# Altium integrated library Mastermind.IntLib: 985 symbols (part 2 of 6)
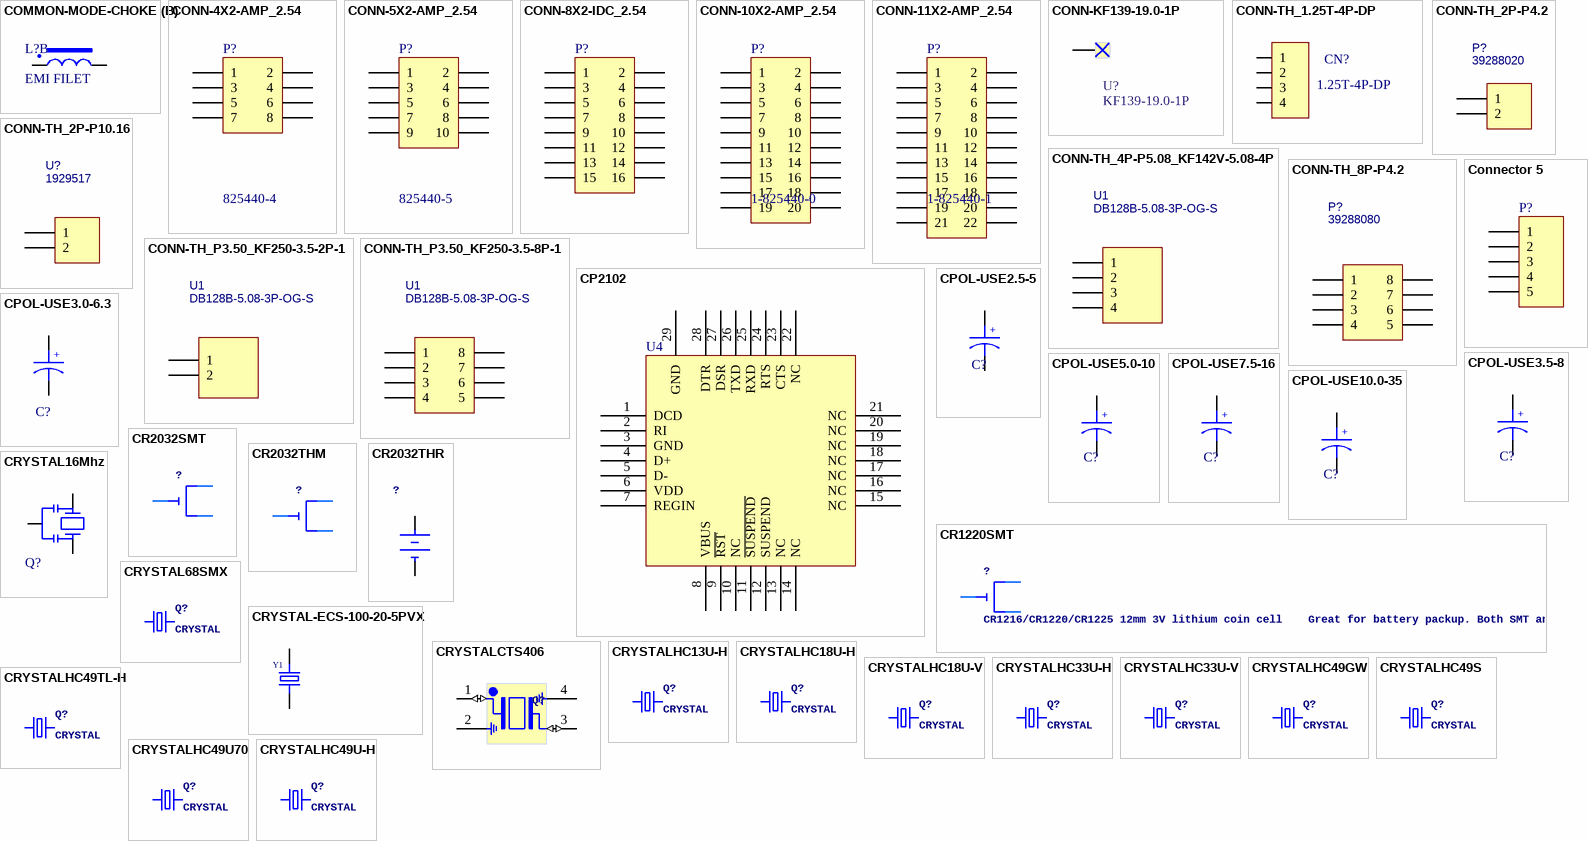
[diagram p41: symbols COMMON-MODE-CHOKE to CRYSTALHC49U-H]

## CONN-8X2-IDC_2.54
designator P?
IDC Connector; LatestRevisionDate: 17-Jul-2002; LatestRevisionNote: Re-released for DXP Platform.; Publisher: Altium Limited
signal-integrity model Connector
footprint 2X08_SHROUDED
pins: 1, 2, 3, 4, 5, 6, 7, 8, 9, 10, 11, 12, 13, 14, 15, 16

## CONN-10X2-AMP_2.54
designator P?, comment 1-825440-0
TE Connectivity AMP Connectors; LatestRevisionDate: 17-Jul-2002; LatestRevisionNote: Re-released for DXP Platform.; Publisher: Altium Limited
signal-integrity model Connector
footprint CONN2X10-AMP
pins: 1, 2, 3, 4, 5, 6, 7, 8, 9, 10, 11, 12, 13, 14, 15, 16, 17, 18, 19, 20

## CONN-11X2-AMP_2.54
designator P?, comment 1-825440-1
TE Connectivity AMP Connectors; LatestRevisionDate: 17-Jul-2002; LatestRevisionNote: Re-released for DXP Platform.; Publisher: Altium Limited
signal-integrity model Connector
footprint CONN2X11-AMP
pins: 1, 2, 3, 4, 5, 6, 7, 8, 9, 10, 11, 12, 13, 14, 15, 16, 17, 18, 19, 20, 21, 22

## CONN-KF139-19.0-1P
designator U?, comment KF139-19.0-1P
Manufacturer: KEFA(科发); Add into BOM: yes; Symbol: KF139-19.0-1P; Device: KF139-19.0-1P; LCSC Part Name: KF139-19.0-1P; Supplier Part: C6392812; Manufacturer Part: KF139-19.0-1P; Supplier Footprint: 插件; JLCPCB Part Class: Extended Part; Datasheet: https://atta.szlcsc.com/upload/public/pdf/source/20230523/9EEA11B50F6D876494A3C4E93D93D143.pdf; Supplier: LCSC; Convert to PCB: yes
footprint CONN-TH_KF139-19.0-1P
pins: 1

## CONN-TH_1.25T-4P-DP
designator CN?, comment 1.25T-4P-DP
CONN-TH_4P-P1.25_1.25T-4P-DP; Manufacturer: 韩国韩荣; Add into BOM: yes; Pins Structure: 1x4P; Pitch: 1.25mm; Number of PINs Per Row: 4; Symbol: 1.25T-4P-DP; Device: 1.25T-4P-DP; LCSC Part Name: 1x4P 间距:1.25mm; Supplier Part: C145936; Manufacturer Part: 1.25T-4P-DP; Supplier Footprint: 插件,P=1.25mm; JLCPCB Part Class: Extended Part; Datasheet: https://atta.szlcsc.com/upload/public/pdf/source/20210511/C145936_7E552BBBEA0510A148F12D708BF3BB1D.pdf; Supplier: LCSC; Convert to PCB: yes; Mounting Style: -; Reference Series: -; Number of Pins: 4P; Number of Rows: 1; Row Spacing: -; Contact Material: Phosphor bronze
footprint CONN-TH_4P-P1.25_1.25T-4P-DP
pins: 1, 2, 3, 4

## CONN-TH_2P-P4.2
designator P?, comment 39288020
MOLEX Pow CONN; Contributor: LCSC; Supplier: LCSC; Supplier Part: C490534; Manufacturer: MOLEX; Manufacturer Part: 39288020; JLCPCB Part Class: Extended Part; spicePre: C; spiceSymbolName: 39288020
footprint CONN-TH_39288020
pins: 1, 2

## CONN-TH_2P-P10.16
designator U?, comment 1929517
60A 600V Green Straight 10.16mm 1 2 Plugin,P=10.16mm Screw terminal ROHS; BOM_Manufacturer: DIBO; BOM_Manufacturer Part: DB128B-5.08-3P-OG-S; Contributor: LCSC; BOM_Supplier: LCSC; BOM_Supplier Part: C500034; BOM_JLCPCB Part Class: Extended Part; spicePre: U; spiceSymbolName: DB128B-5.08-3P-OG-S
footprint CONN-TH_KF139-19.0-2P
pins: 1, 2

## CONN-TH_4P-P5.08_KF142V-5.08-4P
designator U1, comment DB128B-5.08-3P-OG-S
BOM_Manufacturer: DIBO; Contributor: LCSC; BOM_Supplier: LCSC; BOM_Supplier Part: C500034; BOM_Manufacturer Part: DB128B-5.08-3P-OG-S; BOM_JLCPCB Part Class: Extended Part; spicePre: U; spiceSymbolName: DB128B-5.08-3P-OG-S
footprint CONN-TH_4P-P5.08_KF142V-5.08-4P
pins: 1, 2, 3, 4

## CONN-TH_8P-P4.2
designator P?, comment 39288080
Molex POW CONN; Contributor: LCSC; Supplier: LCSC; Supplier Part: C505059; Manufacturer: MOLEX; Manufacturer Part: 39288080; JLCPCB Part Class: Extended Part; spicePre: C; spiceSymbolName: 39288080
footprint CONN-TH_39288080
pins: 1, 2, 3, 4, 5, 6, 7, 8

## CONN-TH_P3.50_KF250-3.5-2P-1
designator U1, comment DB128B-5.08-3P-OG-S
BOM_Manufacturer: DIBO; Contributor: LCSC; BOM_Supplier: LCSC; BOM_Supplier Part: C500034; BOM_Manufacturer Part: DB128B-5.08-3P-OG-S; BOM_JLCPCB Part Class: Extended Part; spicePre: U; spiceSymbolName: DB128B-5.08-3P-OG-S
footprint CONN-TH_P3.50_KF250-3.5-2P-1
pins: 1, 2

## CONN-TH_P3.50_KF250-3.5-8P-1
designator U1, comment DB128B-5.08-3P-OG-S
BOM_Manufacturer: DIBO; Contributor: LCSC; BOM_Supplier: LCSC; BOM_Supplier Part: C500034; BOM_Manufacturer Part: DB128B-5.08-3P-OG-S; BOM_JLCPCB Part Class: Extended Part; spicePre: U; spiceSymbolName: DB128B-5.08-3P-OG-S
footprint CONN-TH_8P-P2.54_KF141V-2.54-8P
pins: 1, 2, 3, 4, 5, 6, 7, 8

## Connector 5
designator P?
XH Header Male Pin 0.100; LatestRevisionDate: 17-Jul-2002; LatestRevisionNote: Re-released for DXP Platform.; Publisher: Altium Limited; JLCPCB#: C146121
signal-integrity model Connector
footprint JST-5-PTH-KIT
footprint JST-5-PTH-ST
footprint JST-5-PTH-KIT - SMD
pins: 1, 2, 3, 4, 5

## CP2102
designator U4
CP2102
footprint QFN28
pins: 1 DCD, 2 RI, 3 GND, 4 D+, 5 D-, 6 VDD, 7 REGIN, 8 VBUS, 9 ~{RST}, 10 NC, 11 ~{SUSPEND}, 12 SUSPEND, 13 NC, 14 NC, 15 NC, 16 NC, 17 NC, 18 NC, 19 NC, 20 NC, 21 NC, 22 NC, 23 CTS, 24 RTS, 25 RXD, 26 TXD, 27 DSR, 28 DTR, 29 GND

## CPOL-USE2.5-5
designator C?, comment 47uF  (value not drawn)
footprint E2,5-5
pins: +, -

## CPOL-USE3.0-6.3
designator C?, comment 47uF  (value not drawn)
footprint E2,5-6.3
pins: +, -

## CPOL-USE3.5-8
designator C?, comment 1000Uf  (value not drawn)
footprint E3,5-8
footprint E3,17-8 -NoOutline
pins: +, -

## CPOL-USE5.0-10
designator C?, comment 10uF  (value not drawn)
footprint E3,5-10
pins: +, -

## CPOL-USE7.5-16
designator C?, comment 10uF  (value not drawn)
footprint E7.5-16
pins: +, -

## CPOL-USE10.0-35
designator C?, comment 10uF  (value not drawn)
footprint E10-35
footprint E10-35-Generic
pins: +, -

## CR1220SMT
designator ?, comment CR1216/CR1220/CR1225 12mm 3V lithium coin cell    Great for battery packup. Both SMT and THM holders.  Note the THM package has the ground pads on both sides of the PCB so that the masks are the same - this reduces the cost
footprint CR1220-SMD
pins: +$1 +, +$2 +1, -

## CR2032SMT
designator ?
footprint CR2032-SMD
pins: +$1 +, +$2 +1, -

## CR2032THM
designator ?
footprint CR2032-THRU
footprint CR2032_HOLDER_SMD
pins: +, +, -

## CR2032THR
designator ?
footprint CR2032_HOLDER_SMD
footprint CR2032-THRUHOLE
pins: +, -

## CRYSTAL16Mhz
designator Q?, comment 16MHz  (value not drawn)
Crystal Osscilator; OC_FARNELL: unknown; OC_NEWARK: unknown
footprint CSTCE16M 3215
pins: 1, 2, 3

## CRYSTAL68SMX
designator Q?, comment CRYSTAL
OC_FARNELL: 6344860; OC_NEWARK: unknown
footprint 86SMX
pins: 1, 4 2

## CRYSTAL-ECS-100-20-5PVX
designator Y1, comment crystal  (value not drawn)
10MHz Â±30ppm Crystal 20pF 60 Ohms HC-49/US; MP: ECS-100-20-5PVX; MF: ECS Inc.; Availability: Warning; SnapEDA_Link: https://www.snapeda.com/parts/ECS-100-20-5PVX/ECS%20Inc./view-part/2721546/?ref=snap; Value: *; Price: None; Package: HC49/US ECS International; Check_prices: https://www.snapeda.com/parts/ECS-100-20-5PVX/ECS%20Inc./view-part/2721546/?ref=eda
footprint HC-49US_L11.5-W4.5-P4.88
footprint OSC-SMD_2P-L5.0-W3.2
footprint XTAL1
pins: 1, 2

## CRYSTALCTS406
designator Q?, comment CRYSTAL  (value not drawn)
CRYSTALCTS406; OC_FARNELL: unknown; OC_NEWARK: unknown; Parameter 1: *
footprint 3225
footprint CRYSTAL-SMD_4P-L3.2-W2.5-BL-2
footprint OSC-SMD_4P-L2.0-W1.6-BL
footprint CRYSTAL-SMD_4P-L2.5-W2.0-BL-A
pins: 1 IN (io), 2 GND, 3 OUT (io), 4 GND

## CRYSTALHC13U-H
designator Q?, comment CRYSTAL
OC_FARNELL: unknown; OC_NEWARK: unknown
footprint HC13U-H
pins: 1, 2

## CRYSTALHC18U-H
designator Q?, comment CRYSTAL
OC_FARNELL: unknown; OC_NEWARK: unknown
footprint HC18U-H
pins: 1, 2

## CRYSTALHC18U-V
designator Q?, comment CRYSTAL
OC_FARNELL: unknown; OC_NEWARK: unknown
footprint HC18U-V
pins: 1, 2

## CRYSTALHC33U-H
designator Q?, comment CRYSTAL
OC_FARNELL: unknown; OC_NEWARK: unknown
footprint HC33U-H
pins: 1, 2

## CRYSTALHC33U-V
designator Q?, comment CRYSTAL
OC_FARNELL: unknown; OC_NEWARK: unknown
footprint HC33U-V
pins: 1, 2

## CRYSTALHC49GW
designator Q?, comment CRYSTAL
OC_FARNELL: unknown; OC_NEWARK: unknown
footprint HC49GW
pins: 1, 2

## CRYSTALHC49S
designator Q?, comment CRYSTAL
OC_FARNELL: 1667008; OC_NEWARK: unknown
footprint HC49/S
pins: 1, 2

## CRYSTALHC49TL-H
designator Q?, comment CRYSTAL
OC_FARNELL: unknown; OC_NEWARK: unknown
footprint HC49TL-H
pins: 1, 2

## CRYSTALHC49U70
designator Q?, comment CRYSTAL
OC_FARNELL: unknown; OC_NEWARK: unknown
footprint HC49U70
pins: 1, 2

## CRYSTALHC49U-H
designator Q?, comment CRYSTAL
OC_FARNELL: 1666973; OC_NEWARK: unknown
footprint HC49U-H
pins: 1, 2

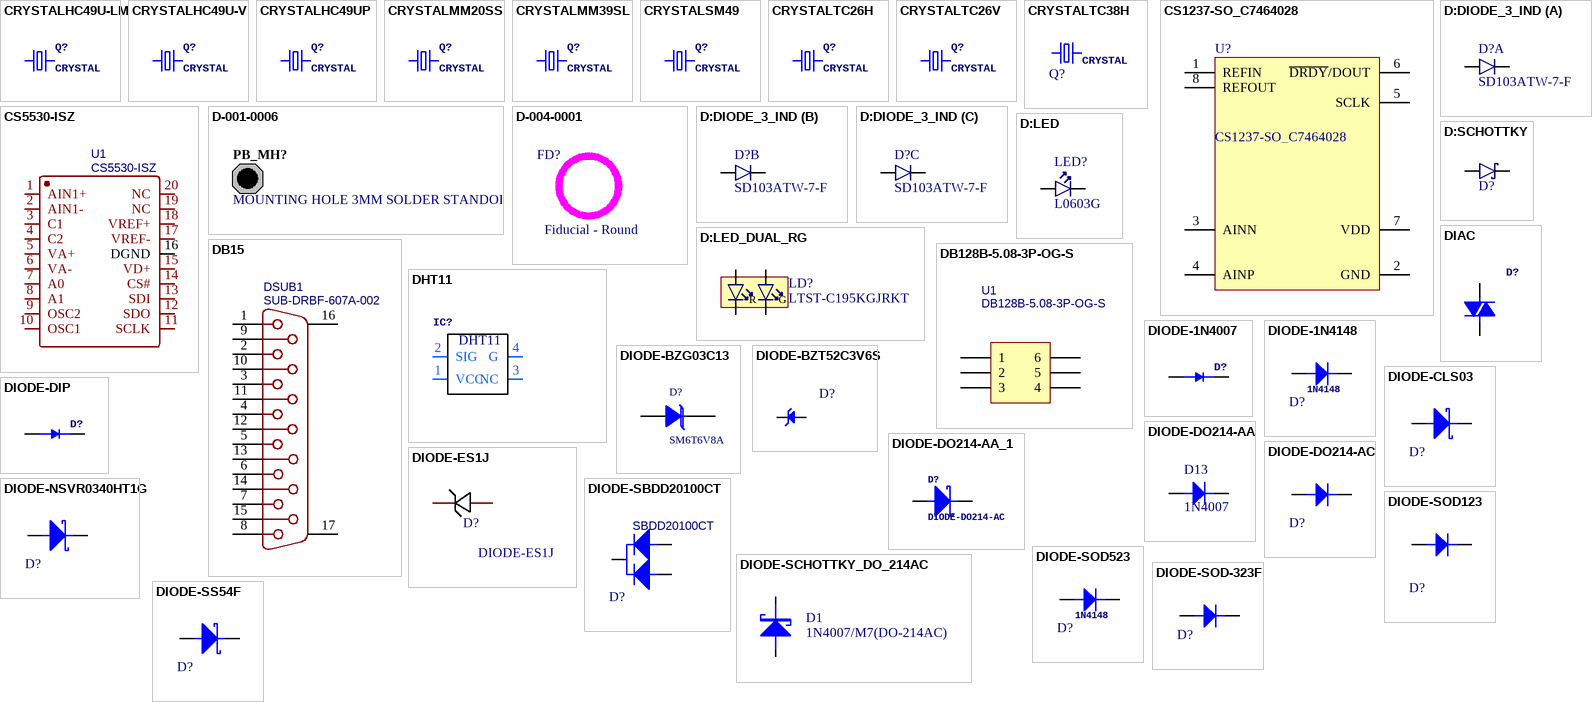
[diagram p9: symbols CRYSTALHC49U-LM to DIODE-SS54F]

## CRYSTALHC49U-LM
designator Q?, comment CRYSTAL
OC_FARNELL: 1666956; OC_NEWARK: unknown
footprint HC49U-LM
pins: 1, 2

## CRYSTALHC49U-V
designator Q?, comment CRYSTAL
OC_FARNELL: 1666969; OC_NEWARK: unknown
footprint HC49U-V
pins: 1, 2

## CRYSTALHC49UP
designator Q?, comment CRYSTAL
OC_FARNELL: unknown; OC_NEWARK: unknown
footprint HC49UP
pins: 1, 2

## CRYSTALMM20SS
designator Q?, comment CRYSTAL
OC_FARNELL: unknown; OC_NEWARK: unknown
footprint MM20SS
pins: 1, 4 2

## CRYSTALMM39SL
designator Q?, comment CRYSTAL
OC_FARNELL: unknown; OC_NEWARK: unknown
footprint MM39SL
pins: 1, 4 2

## CRYSTALSM49
designator Q?, comment CRYSTAL
OC_FARNELL: unknown; OC_NEWARK: unknown
footprint SM49
pins: 1, 2

## CRYSTALTC26H
designator Q?, comment CRYSTAL
OC_FARNELL: unknown; OC_NEWARK: unknown
footprint TC26H
pins: 1, 2

## CRYSTALTC26V
designator Q?, comment CRYSTAL
OC_FARNELL: unknown; OC_NEWARK: unknown
footprint TC26V
pins: 1, 2

## CRYSTALTC38H
designator Q?, comment CRYSTAL
OC_FARNELL: unknown; OC_NEWARK: unknown
footprint TC38H
footprint TC38H - SMD
pins: 1, 2

## CS1237-SO_C7464028
designator U?
CS1237 24-Bit High Precision ADC with Delta-Sigma Modulator; Manufacturer: CHIPSEA(芯海科技); Contributor: lcsc; Supplier: LCSC; Supplier Part: C7464028; Manufacturer Part: CS1237-SO; JLCPCB Part Class: Extended Part; spicePre: U; spiceSymbolName: CS1237-SO_C7464028
footprint SOIC-8E (SOIC, 8-Leads, Body 4.90x3.90mm, Pitch 1.27mm, IPC Medium Density)
pins: 1 REFIN, 2 GND, 3 AINN, 4 AINP, 5 SCLK, 6 ~{DRDY}/DOUT, 7 VDD, 8 REFOUT

## CS5530-ISZ
designator U1
BOM_Manufacturer: Cirrus Logic(凌云); spicePre: X; BOM_Manufacturer Part: CS5530-ISZ; BOM_Supplier: LCSC; BOM_Supplier Part: C9929; BOM_JLCPCB Part Class: Extended Part; spiceSymbolName: CS5530-ISZ
footprint SSOP-20_L7.2-W5.3-P0.65-LS7.8-BL
pins: 1 AIN1+, 2 AIN1-, 3 C1, 4 C2, 5 VA+, 6 VA-, 7 A0, 8 A1, 9 OSC2, 10 OSC1, 11 SCLK, 12 SDO, 13 SDI, 14 CS#, 15 VD+, 16 DGND, 17 VREF-, 18 VREF+, 19 NC, 20 NC

## D-001-0006
designator PB_MH?, comment MOUNTING HOLE 3MM SOLDER STANDOFF  (no BOM)
Mounting Hole for Solder Standoff, M3 Screw, Plated, Round Pad; Category: Mounting-Hole; Status: Production
footprint STANDOFF_SOLDER_3MM
pins: 1 hidden

## D-004-0001
designator FD?, comment Fiducial - Round
Fiducial - Round 1.5mm Top-Bottom; Status: Unreleased; Category: Fiducial
footprint FIDUCIAL ROUND

## D:DIODE_3_IND
designator D?, comment SD103ATW-7-F
Surface Mount Schottky Barrier Diode Array; Manufacturer: Diodes Incorporated; 2nd source part number: 177-3507; Artikkelnr Noca: 10029109; Artikkelnr Simpro: N.A.; Part Number: SD103ATW-7-F; Manufacturer Part Number: SD103ATW-7-F; Datasheet: http://www.diodes.com/datasheets/ds30374.pdf; LatestRevisionDate: 2012-06-15; Publisher: Nordic Semiconductor; Published: 2012-06-15; Value: SD103ATW-7-F; Note: *; Supplier: Digi-Key; Supplier part number: SD103ATW-FDITR-ND; 2nd source Supplier: Farnell; Footprint Doc: SOT-363
footprint SOT-363
part A pins: 1 C1, 6 A1
part B pins: 2 C2, 5 A2
part C pins: 3 C3, 4 A3

## D:LED
designator LED?, comment L0603G
LED SMARTLED GREEN 570NM 0603; Part Number: LG L29K Smartled Green; Manufacturer: Multicomp; Manufacturer Part Number: LG L29K-G2J1-24-Z; Note: 2,24..5.6 mcd, Vfmin=1.7V; Artikkelnr Noca: N.A.; Datasheet: http://www.osram-os.com/Graphics/XPic2/00077107_0.pdf; Footprint Doc: 0603; LatestRevisionDate: 2014-10-28; Pin Count: 2; Publisher: Nordic Semiconductor; Published: 2014-10-28; Value: L0603G; Supplier: Digi-Key; Supplier part number: 475-2709-1-ND; 2nd source Supplier: *; 2nd source part number: *; Artikkelnr Simpro: N.A.
footprint LED_0603_G
pins: 1 C, 2 A

## D:LED_DUAL_RG
designator LD?, comment LTST-C195KGJRKT
Ultra bright AlInGaP Bi-Color LED; Manufacturer: Lite-On Inc; 2nd source part number: 859-LTST-C195KGJRKT; Artikkelnr Noca: 13019145; Artikkelnr Simpro: N.A.; Part Number: LTST-C195KGJRKT; Manufacturer Part Number: LTST-C195KGJRKT; Datasheet: http://media.digikey.com/pdf/Data%20Sheets/Lite-On%20PDFs/LTST-C195KGJRKT.pdf; LatestRevisionDate: 2013-02-11; Pin Count: 4; Publisher: Nordic Semiconductor; Published: 2012-07-05; Value: LTST-C195KGJRKT; Note: *; Supplier: Digi-Key; Supplier part number: 160-1452-1-ND; 2nd source Supplier: Mouser; Footprint Doc: LED_DUAL_0606
footprint LED_DUAL_0606
pins: 1 A2, 2 A1, 3 C2, 4 C1
text: R; G

## D:SCHOTTKY
designator D?, comment 1PS79SB30.115  (value not drawn)
Diode Schottky Vf=0.38, Vr=40V, If=200mA, Ir=500nA; Manufacturer: NXP; Artikkelnr Noca: N.A.; Part Number: 1PS79SB30.115; Manufacturer Part Number: 1PS79SB30.115; Datasheet: http://www.nxp.com/documents/data_sheet/1PS79SB30.pdf; Footprint Doc: SOD-523; LatestRevisionDate: 2014-09-24; Pin Count: 2; Publisher: Nordic Semiconductor; Published: 2014-09-24; Value: 1PS79SB30.115; Note: *; Supplier: Digi-Key; Supplier part number: 568-5973-1-ND; 2nd source Supplier: *; 2nd source part number: *; Artikkelnr Simpro: N.A.
footprint SOD-523
pins: A, K C

## DB15
designator DSUB1, comment SUB-DRBF-607A-002
BOM_Manufacturer: Nextron(正凌); Contributor: LCSC; BOM_Supplier: LCSC; BOM_Supplier Part: C2846090; BOM_Manufacturer Part: SUB-DRBF-607A-002; BOM_JLCPCB Part Class: Extended Part; spicePre: D; spiceSymbolName: SUB-DRBF-607A-002
footprint DSUB-TH_FDB1502-F0DB300K6KA-Female
footprint DSUB-TH_FDB1502-F0DB300K6KA-Male
pins: 1, 2, 3, 4, 5, 6, 7, 8, 9, 10, 11, 12, 13, 14, 15, 16 MH2, 17 MH1

## DB128B-5.08-3P-OG-S
designator U1
BOM_Manufacturer: DIBO; Contributor: LCSC; BOM_Supplier: LCSC; BOM_Supplier Part: C500034; BOM_Manufacturer Part: DB128B-5.08-3P-OG-S; BOM_JLCPCB Part Class: Extended Part; spicePre: U; spiceSymbolName: DB128B-5.08-3P-OG-S
footprint CONN-TH_DB128B-5.08-3P-XX-S
footprint CONN-TH_KF250T-5.0-2X3P
pins: 1, 2, 3, 4, 5, 6

## DHT11
designator IC?, comment TIMERChanged DIP package to have round (not oval) pin pads    http://www.ladyada.net/library/pcb/eaglelibrary.html
footprint DHT11
pins: 1 VCC (power), 2 SIG, 3 NC (power), 4 G

## DIAC
designator D?, comment Diac  (value not drawn)
footprint TO220DS
pins: T1 A1, T2 A2

## DIODE-1N4007
designator D?
DIODE   General purpose 1N400x type rectifier    (With bigger pads)   http://www.ladyada.net/library/pcb/eaglelibrary.html
footprint DO41-10
pins: A, C

## DIODE-1N4148
designator D?, comment 1N4148
footprint DO-1N4148
footprint DO100-AA
footprint DO-1N4148 - 10mm
pins: A, K

## DIODE-BZG03C13
designator D?, comment SM6T6V8A
Zener TVS, 6.2V, 5W; Manufacturer: Microsemi; Revision: 31-Oct-2003
footprint DO214
pins: 1 A, 2 K

## DIODE-BZT52C3V6S
designator D?, comment BZT52C3V6S/W4  (value not drawn)
Independent Type 200mW 3.6V~3.8V 3.4V SOD-323 Zener Diodes ROHS; Manufacturer: YFW(佑风微); Symbol: BZT52C3V6S_C5270767; Add into BOM: yes; Reverse Leakage Current (Ir): 5uA@1V; Zener Impedance (Zzt): 90Ω; Device: BZT52C3V6S_C5270767; LCSC Part Name: BZT52C3V6S; Manufacturer Part: BZT52C3V6S; Supplier Footprint: SOD-323; JLCPCB Part Class: Extended Part; Datasheet: https://atta.szlcsc.com/upload/public/pdf/source/20221116/07630275E16F5BD1867C326257346985.pdf; Supplier: LCSC; Convert to PCB: yes; Diode Configuration: Independent Type; Zener Voltage (Nom): 3.4V; Zener Voltage (Range): 3.6V~3.8V; Power Dissipation: 200mW; Supplier Part: C5270767
footprint SOD-323
pins: A (power), K C (power)

## DIODE-CLS03
designator D?, comment CLS03  (value not drawn)
Diode; Designator: *
footprint SMC_L5.9-W4.1-LS8.7-RD
pins: 1 C, 2 A

## DIODE-DIP
designator D?
DIODE   General purpose 1N400x type rectifier    (With bigger pads)   http://www.ladyada.net/library/pcb/eaglelibrary.html
footprint DO41-10
pins: A, C

## DIODE-DO214-AA
designator D13, comment 1N4007
SMD Diode DO214-AC
footprint DO214-AA
pins: A, C

## DIODE-DO214-AA_1
designator D?, comment DIODE-DO214-AC
Diode   SMADIODE - SMA Surface Mount Package  20V 1A Schottky Diode Digikey: 641-1014-6-ND    DO-1N4148 - Through Hole Small Current Diode SOD-123 20V 1 A (.5mV Vf) Schottky Diode - Digikey: MBRX120TPMSCT-ND    SOD-323 10V 570mA (.38mV Vf, 3ns) Schottky Diode - Digikey: ZLLS410CT-ND    SOD-523 30V 30mA Schottky Diode (RB751S-40TE61) - Digikey: RB751S-40TE61CT-ND    SOT23-R/W - SOT23 Package (R = Solder Paste/Reflow Ovens, W = Hand-Soldering)  BAT54Film 40V 300mA - Digikey: 497-7162-1-ND
footprint DO214-AA
pins: A, C

## DIODE-DO214-AC
designator D?  (value not drawn)
Designator: *
footprint DO214-AC
pins: A, C

## DIODE-ES1J
designator D?
Manufacturer: MDD(辰达半导体); Manufacturer Part: ES1J; Symbol: ES1JG_C412438; Device: ES1J_C412438; Add into BOM: yes; Forward Voltage (Vf@If): 1.7V@1A; Reverse Leakage Current: 5uA@600V; LCSC Part Name: 电压:600V 电流:1A; Supplier Part: C412438; Supplier Footprint: SMA; JLCPCB Part Class: Extended Part; Datasheet: https://atta.szlcsc.com/upload/public/pdf/source/20230314/8FCBE4D1988E86B6B35ACD92F03E7C76.pdf; Supplier: LCSC; Convert to PCB: yes; Operating Temperature: -55℃~+150℃@(Tj)
footprint SMA_L4.4-W2.8-LS5.4-RD
pins: 1 C, 2 A

## DIODE-NSVR0340HT1G
designator D?, comment NSVR0340HT1G  (value not drawn)
Schottky Diode / NSVR0340HT1G; Designator: *
footprint SOD-323
pins: A, K C

## DIODE-SBDD20100CT
designator D?, comment SBDD20100CT
Schottky Barrier Diodes; Manufacturer: CJ(江苏长电/长晶); Contributor: LCSC; Supplier: LCSC; Supplier Part: C513356; Manufacturer Part: SBDD20100CT; JLCPCB Part Class: Extended Part; spicePre: U; spiceSymbolName: SBDD20100CT
footprint TO252
pins: 1 A, 2 A, 3 K

## DIODE-SCHOTTKY_DO_214AC
designator D1, comment 1N4007/M7(DO-214AC)
Surface mount schottky diode DO-214AC(SMA) Package
footprint SMT_DIODE_DO_214AC (DO-214AC(SMA) Package)
pins: 1 A, 2 K

## DIODE-SOD123
designator D?
Schottky Diode
footprint SOD-123
footprint SOD-123HE1_L3.0-W2.0-LS3.7-RD
pins: 1 C, 2 A

## DIODE-SOD523
designator D?, comment 1N4148
footprint SOD-523
pins: A, K C

## DIODE-SOD-323F
designator D?, comment Diode   SMADIODE - SMA Surface Mount Package  20V 1A Schottky Diode Digikey: 641-1014-6-ND    DO-1N4148 - Through Hole Small Current Diode SOD-123 20V 1 A (.5mV Vf) Schottky Diode - Digikey: MBRX120TPMSCT-ND    SOD-323 10V 570mA (.38mV Vf, 3ns) Schottky Diode - Digikey: ZLLS410CT-ND    SOD-523 30V 30mA Schottky Diode (RB751S-40TE61) - Digikey: RB751S-40TE61CT-ND    SOT23-R/W - SOT23 Package (R = Solder Paste/Reflow Ovens, W = Hand-Soldering)  BAT54Film 40V 300mA - Digikey: 497-7162-1-ND  (value not drawn)
Parameter 1: *
footprint SOD-323
pins: A, K C

## DIODE-SS54F
designator D?, comment DIODE-DO214-AC  (value not drawn)
Schottky Diode; Designator: *
footprint DO214-AC
pins: A, C

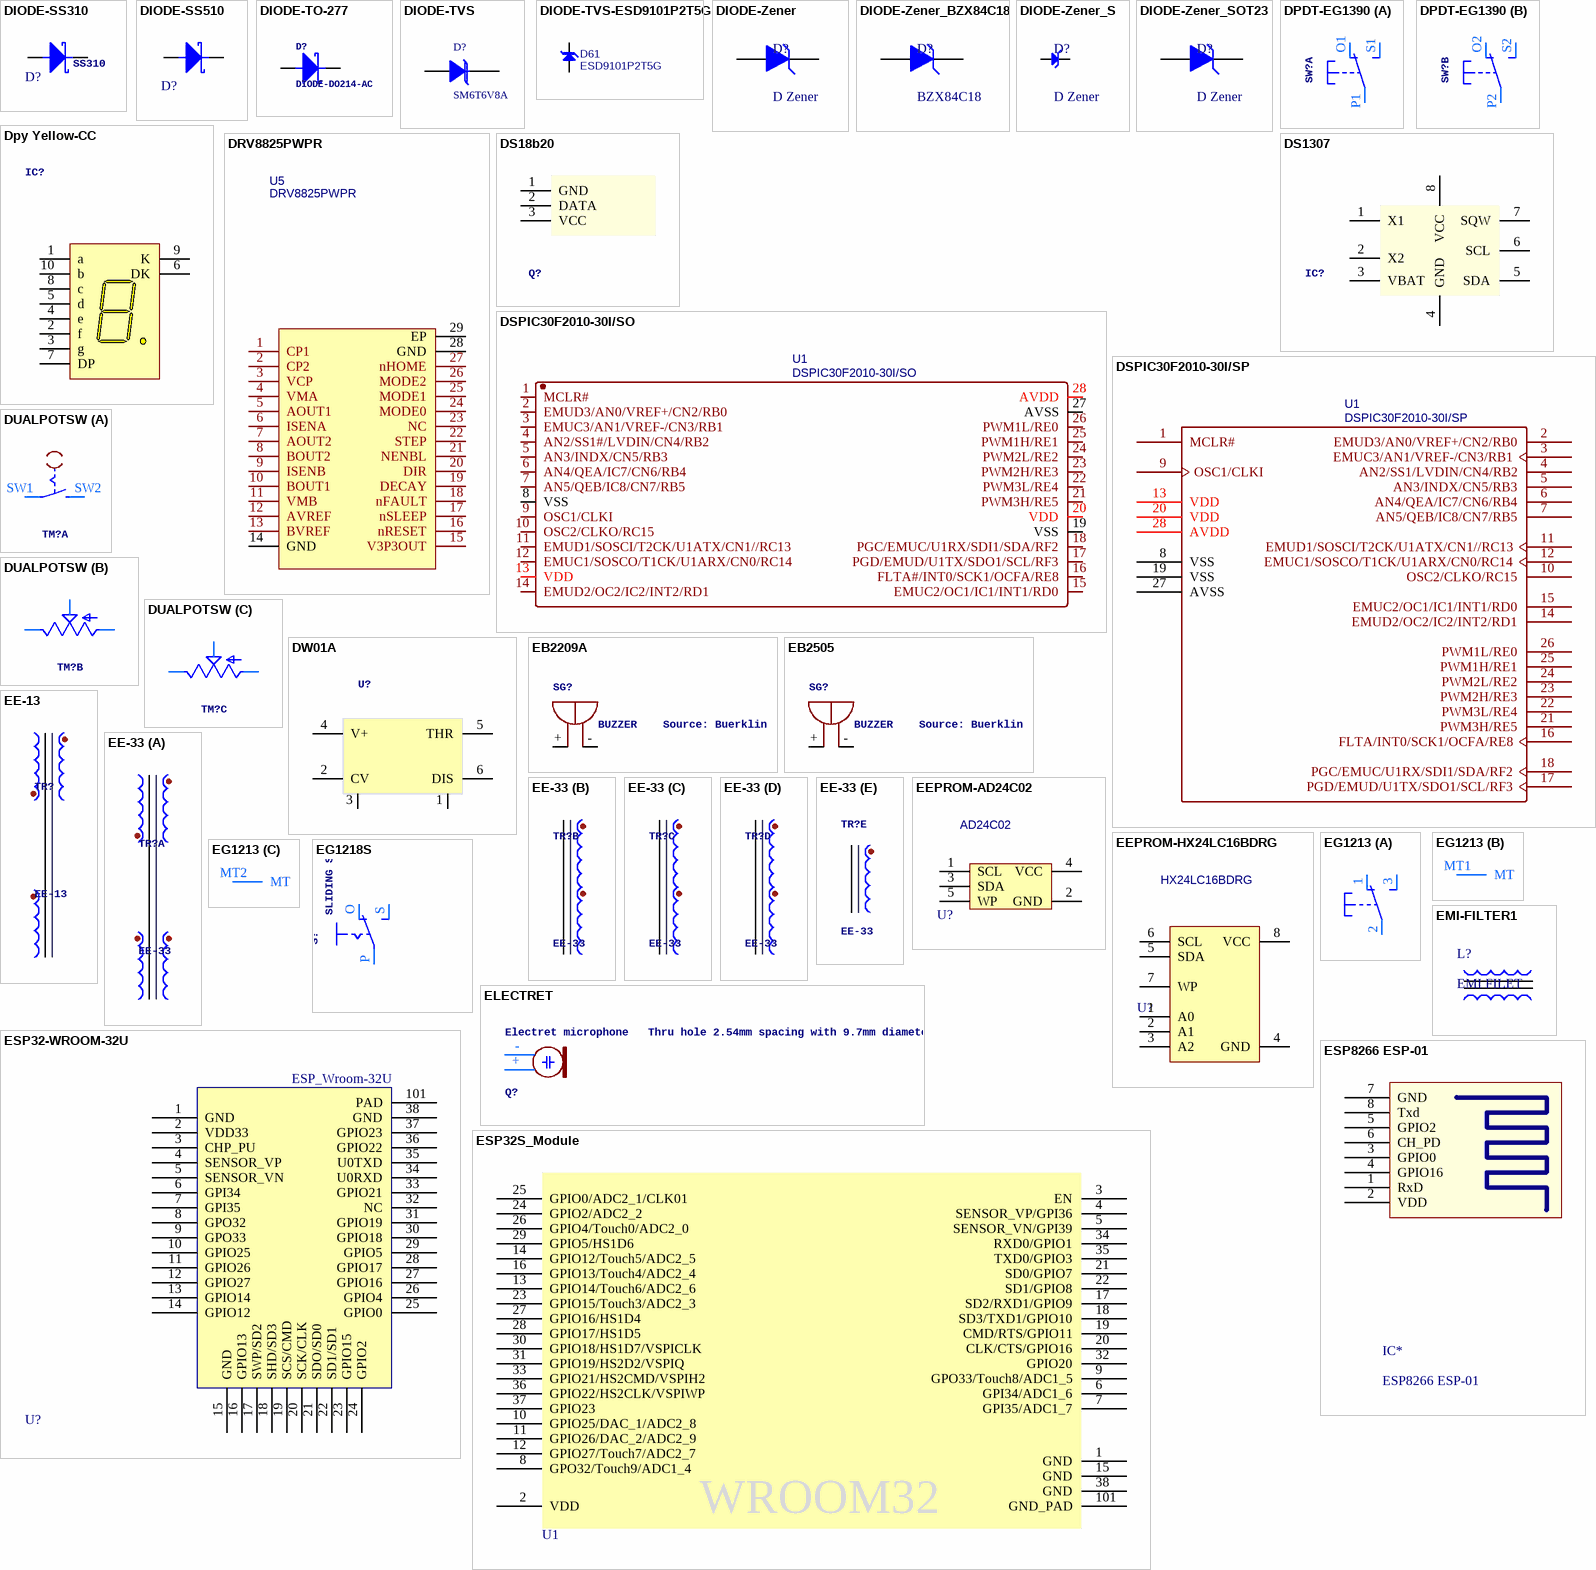
[diagram p10: symbols DIODE-SS310 to ESP8266 ESP-01]

## DIODE-SS310
designator D?, comment SS310
Schottky Diode
footprint DO214A
pins: 1 A, 2 C

## DIODE-SS510
designator D?, comment SS510  (value not drawn)
Schottky Diode; Designator: *
footprint SMC_L7.1-W6.2-LS8.1-RD
pins: 1 C, 2 A

## DIODE-TO-277
designator D?, comment DIODE-DO214-AC
Schottky Diode
footprint TO-277
pins: A, C

## DIODE-TVS
designator D?, comment SM6T6V8A
Tvs Diode, 6.2V, 5W; Manufacturer: Microsemi; Revision: 31-Oct-2003
footprint DO214
pins: 1 A, 2 K

## DIODE-TVS-ESD9101P2T5G
designator D61, comment ESD9101P2T5G
ESD Protection Diode; Manufacturer Name: OnSemi; Manufacturer Part No.: ESD9101P2T5G
footprint SOD-923 (SOD-923, 2-Leads, Body 0.60x1.00mm, IPC Medium Density)
pins: 1 C (power), 2 A (power)

## DIODE-Zener
designator D?, comment D Zener
Zener Diode; Published: 8-Jun-2000; LatestRevisionDate: 17-Jul-2002; LatestRevisionNote: Re-released for DXP Platform.; PackageReference: DIODE-0.7; Publisher: Altium Limited; PackageDescription: Diode, Thru-Hole; 2 Leads; 0.7 in Pin Spacing
simulation model ZENER (Diode)
signal-integrity model D Zener
footprint SOD-323
footprint DO100-AA
footprint DO-1N4148
footprint DO-1N4148 - 10mm
footprint SOD-123HE1_L3.0-W2.0-LS3.7-RD - KA
pins: A, K

## DIODE-Zener_BZX84C18
designator D?, comment BZX84C18
Zener Diode 18V; Published: 8-Jun-2000; LatestRevisionDate: 17-Jul-2002; LatestRevisionNote: Re-released for DXP Platform.; PackageReference: DIODE-0.7; Publisher: Altium Limited; PackageDescription: Diode, Thru-Hole; 2 Leads; 0.7 in Pin Spacing
footprint SOT23; pin to pad 1>1+2
pins: 1 A, 3 K

## DIODE-Zener_S
designator D?, comment D Zener
Zener Diode, Vz=15V, 300mW; Published: 8-Jun-2000; LatestRevisionDate: 17-Jul-2002; LatestRevisionNote: Re-released for DXP Platform.; PackageReference: DIODE-0.7; Publisher: Altium Limited; PackageDescription: Diode, Thru-Hole; 2 Leads; 0.7 in Pin Spacing
simulation model ZENER (Diode)
signal-integrity model D Zener
footprint SOD-323
pins: A (power), K C (power)

## DIODE-Zener_SOT23
designator D?, comment D Zener
Zener Diode; Published: 8-Jun-2000; LatestRevisionDate: 17-Jul-2002; LatestRevisionNote: Re-released for DXP Platform.; PackageReference: DIODE-0.7; Publisher: Altium Limited; PackageDescription: Diode, Thru-Hole; 2 Leads; 0.7 in Pin Spacing
footprint SOT23
pins: 1 A, 3 K

## DPDT-EG1390
designator SW?
footprint EG1390
part A pins: O1 O, P1 P, S1 S
part B pins: O2 O, P2 P, S2 S

## Dpy Yellow-CC
designator IC?, comment TIMERChanged DIP package to have round (not oval) pin pads    http://www.ladyada.net/library/pcb/eaglelibrary.html  (value not drawn)
footprint 7-Segment
pins: 1 a "Anode", 2 f "Anode", 3 g "Anode", 4 e "Anode", 5 d "Anode", 6 DK "Cathode", 7 DP "Anode", 8 c "Anode", 9 K "Cathode", 10 b "Anode"

## DRV8825PWPR
designator U5
BOM_Manufacturer: TI(德州仪器); BOM_Supplier: LCSC; BOM_Manufacturer Part: DRV8825PWPR; BOM_Supplier Part: C81582; BOM_JLCPCB Part Class: Extended Part; spicePre: U; spiceSymbolName: DRV8825PWPR
footprint HTSSOP-28_L9.7-W4.4-P0.65-LS6.4-BL-EP
pins: 1 CP1, 2 CP2, 3 VCP, 4 VMA, 5 AOUT1, 6 ISENA, 7 AOUT2, 8 BOUT2, 9 ISENB, 10 BOUT1, 11 VMB, 12 AVREF, 13 BVREF, 14 GND, 15 V3P3OUT, 16 nRESET, 17 nSLEEP, 18 nFAULT, 19 DECAY, 20 DIR, 21 NENBL, 22 STEP, 23 NC, 24 MODE0, 25 MODE1, 26 MODE2, 27 nHOME, 28 GND, 29 EP

## DS18b20
designator Q?
Dellas temperature sensor
footprint TO92-INLINE
pins: 1 GND, 2 DATA, 3 VCC

## DS1307
designator IC?, comment DS1307   Real time clock (RTC) with battery backup ability. Talk to it via i2c  (value not drawn)
footprint DIL08
footprint SOP8
pins: 1 X1, 2 X2, 3 VBAT, 4 GND, 5 SDA, 6 SCL, 7 SQW (power), 8 VCC (power)

## DSPIC30F2010-30I/SO
designator U1
Manufacturer: MICROCHIP(美国微芯); Supplier: LCSC; Manufacturer Part: DSPIC30F2010-30I/SO; Supplier Part: C9797; JLCPCB Part Class: Extended Part; spicePre: U; spiceSymbolName: DSPIC30F2010-30I/SO
footprint SOIC-28_L18.0-W7.5-P1.27-LS10.3-BL
pins: 1 MCLR#, 2 EMUD3/AN0/VREF+/CN2/RB0, 3 EMUC3/AN1/VREF-/CN3/RB1, 4 AN2/SS1#/LVDIN/CN4/RB2, 5 AN3/INDX/CN5/RB3, 6 AN4/QEA/IC7/CN6/RB4, 7 AN5/QEB/IC8/CN7/RB5, 8 VSS, 9 OSC1/CLKI, 10 OSC2/CLKO/RC15, 11 EMUD1/SOSCI/T2CK/U1ATX/CN1//RC13, 12 EMUC1/SOSCO/T1CK/U1ARX/CN0/RC14, 13 VDD, 14 EMUD2/OC2/IC2/INT2/RD1, 15 EMUC2/OC1/IC1/INT1/RD0, 16 FLTA#/INT0/SCK1/OCFA/RE8, 17 PGD/EMUD/U1TX/SDO1/SCL/RF3, 18 PGC/EMUC/U1RX/SDI1/SDA/RF2, 19 VSS, 20 VDD, 21 PWM3H/RE5, 22 PWM3L/RE4, 23 PWM2H/RE3, 24 PWM2L/RE2, 25 PWM1H/RE1, 26 PWM1L/RE0, 27 AVSS, 28 AVDD

## DSPIC30F2010-30I/SP
designator U1
Manufacturer: MICROCHIP(美国微芯); Supplier: LCSC; Manufacturer Part: DSPIC30F2010-30I/SP; Supplier Part: C134088; JLCPCB Part Class: Extended Part; spicePre: U; spiceSymbolName: DSPIC30F2010-30I/SP
footprint DIP-28_L34.6-W7.3-P2.54-LS10.2-BL
pins: 1 MCLR#, 2 EMUD3/AN0/VREF+/CN2/RB0, 3 EMUC3/AN1/VREF-/CN3/RB1, 4 AN2/SS1/LVDIN/CN4/RB2, 5 AN3/INDX/CN5/RB3, 6 AN4/QEA/IC7/CN6/RB4, 7 AN5/QEB/IC8/CN7/RB5, 8 VSS, 9 OSC1/CLKI, 10 OSC2/CLKO/RC15, 11 EMUD1/SOSCI/T2CK/U1ATX/CN1//RC13, 12 EMUC1/SOSCO/T1CK/U1ARX/CN0/RC14, 13 VDD, 14 EMUD2/OC2/IC2/INT2/RD1, 15 EMUC2/OC1/IC1/INT1/RD0, 16 FLTA/INT0/SCK1/OCFA/RE8, 17 PGD/EMUD/U1TX/SDO1/SCL/RF3, 18 PGC/EMUC/U1RX/SDI1/SDA/RF2, 19 VSS, 20 VDD, 21 PWM3H/RE5, 22 PWM3L/RE4, 23 PWM2H/RE3, 24 PWM2L/RE2, 25 PWM1H/RE1, 26 PWM1L/RE0, 27 AVSS, 28 AVDD

## DUALPOTSW
designator TM?
footprint RK0971221
part A pins: SW1 P, SW2 S
part B pins: A2 E, B2 A, W2 S
part C pins: A1 E, B1 A, W1 S

## DW01A
designator U?
footprint SOT23-6
pins: 1 TR, 2 CV, 3 GND (power), 4 V+ (power), 5 THR, 6 DIS

## EB2209A
designator SG?, comment BUZZER    Source: Buerklin
OC_FARNELL: unknown; OC_NEWARK: unknown
footprint EB2209A
pins: +, -

## EB2505
designator SG?, comment BUZZER    Source: Buerklin
OC_FARNELL: unknown; OC_NEWARK: unknown
footprint EB2505
pins: +, -

## EE-13
designator TR?
TRANSFORMER   1 primary winding, 2 secondary windings   ERA
footprint EE13
footprint EE13 - thx208
pins: 1, 2, 3, 4, 5, 6

## EE-33
designator TR?
EI33 EE33 18+18pin Vertical Transfomer Bobbin+PC40 ferrite core
footprint EE33
part A pins: 1 NC hidden to GND, 2 NC hidden to GND, 3 NC hidden to GND, 13, 14, 15, 16, 19, 20, 21 NC hidden to GND, 22, 23
part B pins: 4, 5, 6
part C pins: 7, 8, 9
part D pins: 10, 11, 12
part E pins: 17, 18

## EEPROM-AD24C02
designator U?, comment AD24C02
Manufacturer: IDCHIP(英锐芯); Contributor: lcsc; Supplier: LCSC; Supplier Part: C5125083; Manufacturer Part: AD24C02; JLCPCB Part Class: Extended Part; spicePre: U; spiceSymbolName: AD24C02
footprint SOT23-5L
pins: 1 SCL, 2 GND, 3 SDA, 4 VCC, 5 WP

## EEPROM-HX24LC16BDRG
designator U?, comment HX24LC16BDRG
EEPROM; Manufacturer: HGC(深圳汉芯); Contributor: lcsc; Supplier: LCSC; Supplier Part: C2987259; Manufacturer Part: HX24LC16BDRG; JLCPCB Part Class: Extended Part; spicePre: U; spiceSymbolName: HX24LC16BDRG
footprint SOIC-8_L4.9-W3.9-P1.27-LS6.0-BL
footprint SOIC-8E (SOIC, 8-Leads, Body 4.90x3.90mm, Pitch 1.27mm, IPC Medium Density)
pins: 1 A0, 2 A1, 3 A2, 4 GND, 5 SDA, 6 SCL, 7 WP, 8 VCC

## EG1213
designator S?, comment E-Switch right-angle slide SPDT Part #EG1213    http://www.ladyada.net/library/eagle  (value not drawn)
footprint EG1213
part A pins: 1 O, 2 P, 3 S
part B pins: MT1 MT
part C pins: MT2 MT

## EG1218S
designator S?, comment SLIDING SWITCH   0.1" spacing through hole, vertical SPDT slide switch    http://www.ladyada.net/library/pcb/eaglelibrary.html
footprint EG1218
pins: O, P, S

## ELECTRET
designator Q?, comment Electret microphone   Thru hole 2.54mm spacing with 9.7mm diameter
footprint 9.7ELECTRET
pins: + 2, - 1

## EMI-FILTER1
designator L?, comment EMI FILET
Common Mode Noise Filter
footprint FIL_DLW5BTM501SQ2L
footprint FIL_CoreXX
footprint FIL_Z0021A
pins: 1, 2, 3, 4

## ESP32-WROOM-32U
designator U?, comment ESP-Wroom-32U_Module  (value not drawn)
WiFi Modules ROHS; Datasheet: https://espressif.com/sites/default/files/documentation/esp_wroom_32_datasheet_en.pdf
footprint ESP32-WROOM-32U (Esp32S Module wide for hand soldering)
pins: 1 GND (power), 2 VDD33 (power), 3 CHP_PU (power), 4 SENSOR_VP, 5 SENSOR_VN, 6 GPI34, 7 GPI35, 8 GPO32, 9 GPO33, 10 GPIO25, 11 GPIO26, 12 GPIO27, 13 GPIO14, 14 GPIO12, 15 GND (power), 16 GPIO13, 17 SWP/SD2, 18 SHD/SD3, 19 SCS/CMD, 20 SCK/CLK, 21 SDO/SD0, 22 SD1/SD1, 23 GPIO15, 24 GPIO2, 25 GPIO0, 26 GPIO4, 27 GPIO16, 28 GPIO17, 29 GPIO5, 30 GPIO18, 31 GPIO19, 32 NC, 33 GPIO21, 34 U0RXD, 35 U0TXD, 36 GPIO22, 37 GPIO23, 38 GND (power), 101 PAD (power)
text: ESP_Wroom-32U

## ESP32S_Module
designator U1  (value not drawn)
Esp-32S; Datasheet: https://espressif.com/sites/default/files/documentation/esp_wroom_32_datasheet_en.pdf
footprint ESP32S (ESP32S-Module)
footprint ESP32S_W (Esp32S Module wide for hand soldering)
pins: 1 GND (power), 2 VDD (power), 3 EN (power), 4 SENSOR_VP/GPI36, 5 SENSOR_VN/GPI39, 6 GPI34/ADC1_6, 7 GPI35/ADC1_7, 8 GPO32/Touch9/ADC1_4, 9 GPO33/Touch8/ADC1_5, 10 GPIO25/DAC_1/ADC2_8, 11 GPIO26/DAC_2/ADC2_9, 12 GPIO27/Touch7/ADC2_7, 13 GPIO14/Touch6/ADC2_6, 14 GPIO12/Touch5/ADC2_5, 15 GND (power), 16 GPIO13/Touch4/ADC2_4, 17 SD2/RXD1/GPIO9, 18 SD3/TXD1/GPIO10, 19 CMD/RTS/GPIO11, 20 CLK/CTS/GPIO16, 21 SD0/GPIO7, 22 SD1/GPIO8, 23 GPIO15/Touch3/ADC2_3, 24 GPIO2/ADC2_2, 25 GPIO0/ADC2_1/CLK01, 26 GPIO4/Touch0/ADC2_0, 27 GPIO16/HS1D4, 28 GPIO17/HS1D5, 29 GPIO5/HS1D6, 30 GPIO18/HS1D7/VSPICLK, 31 GPIO19/HS2D2/VSPIQ, 32 GPIO20, 33 GPIO21/HS2CMD/VSPIH2, 34 RXD0/GPIO1, 35 TXD0/GPIO3, 36 GPIO22/HS2CLK/VSPIWP, 37 GPIO23, 38 GND (power), 101 GND_PAD (power)
text: WROOM32

## ESP8266 ESP-01
designator IC*
footprint ESP8266 ESP-01
pins: 1 RxD, 2 VDD, 3 GPIO0, 4 GPIO16, 5 GPIO2, 6 CH_PD, 7 GND, 8 Txd

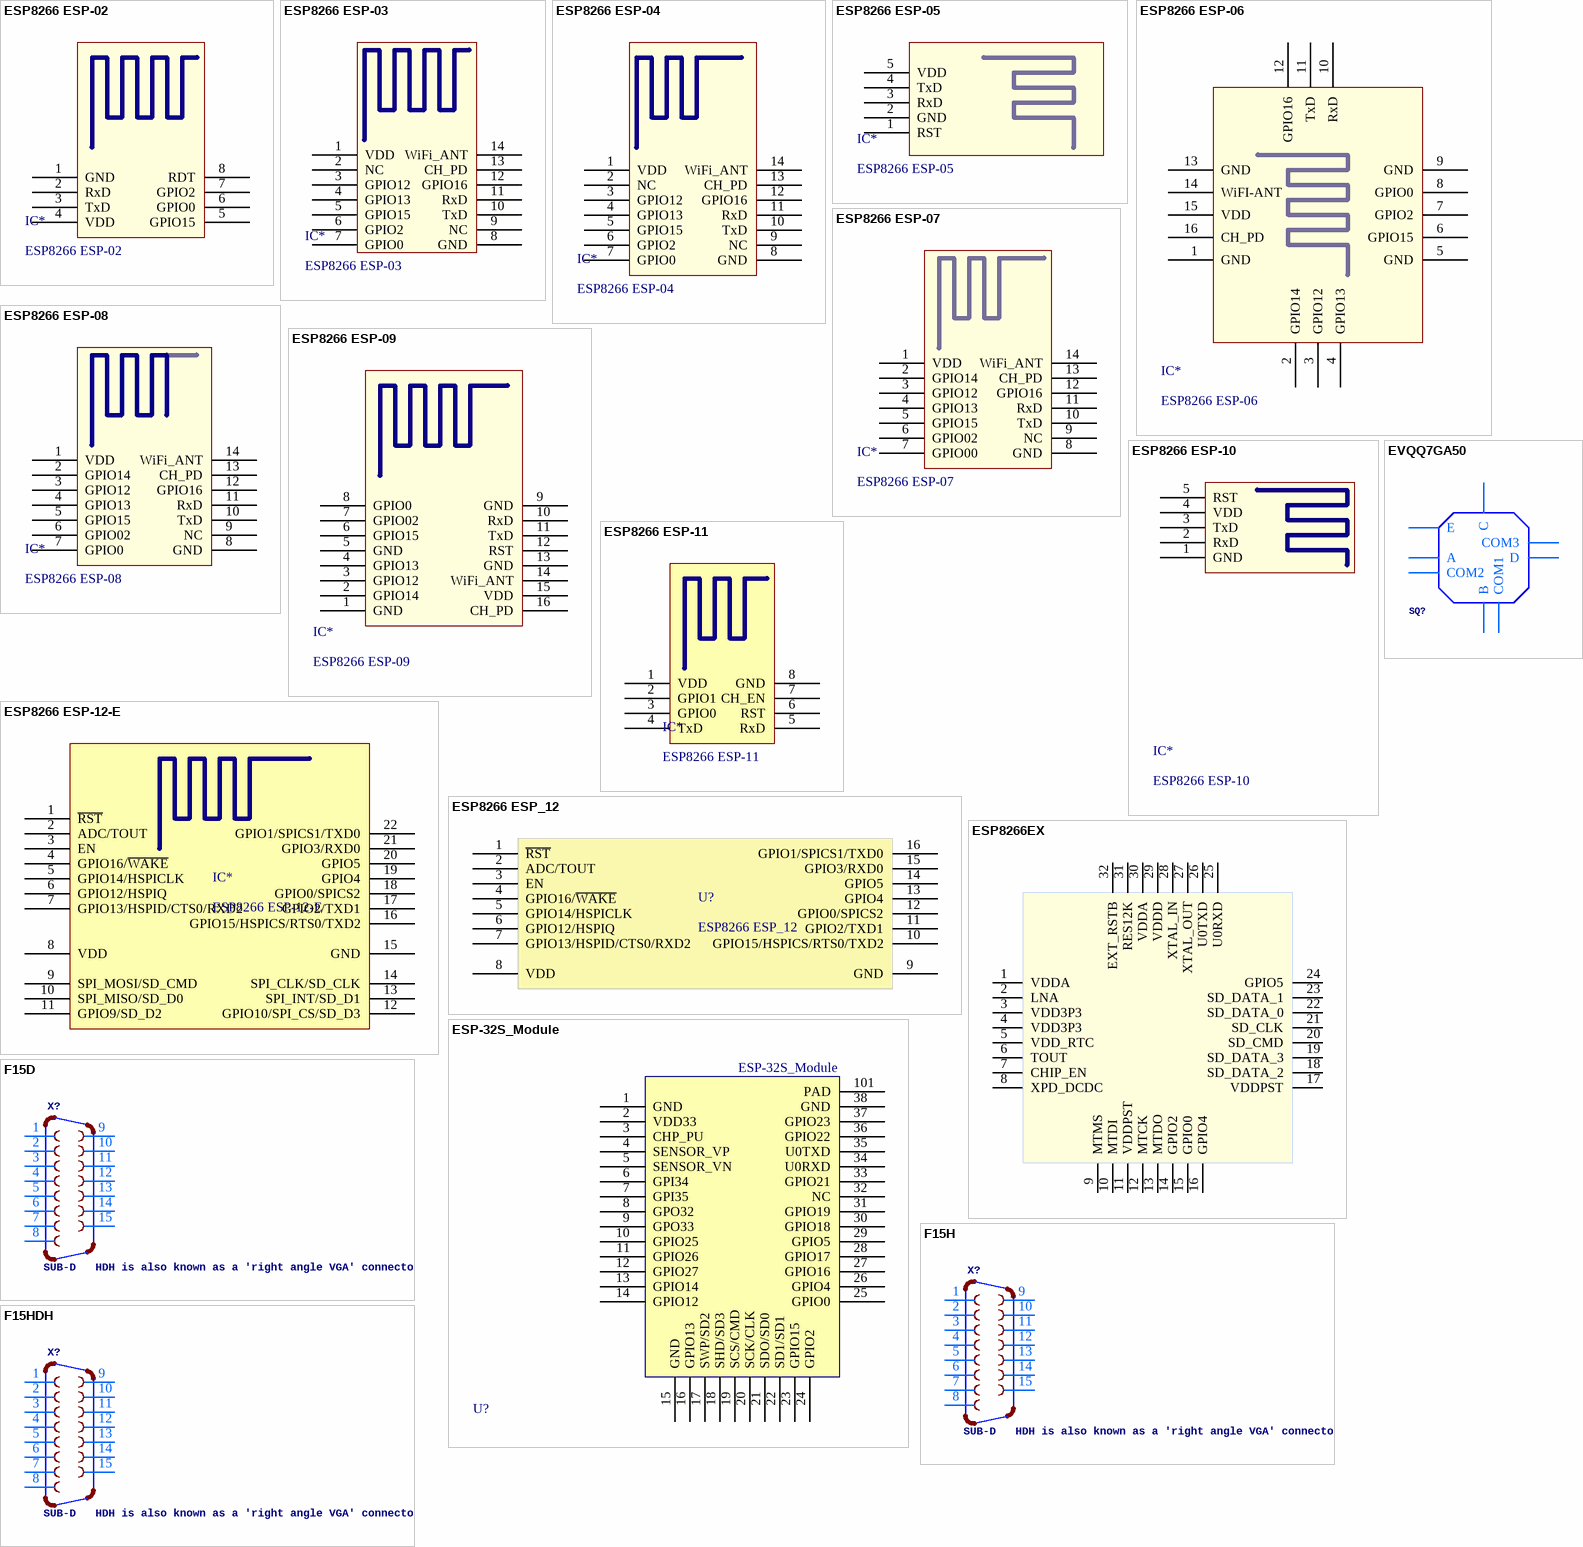
[diagram p11: symbols ESP8266 ESP-02 to F15HDH]

## ESP8266 ESP-02
designator IC*
footprint ESP8266 ESP-02
pins: 1 GND, 2 RxD, 3 TxD, 4 VDD, 5 GPIO15, 6 GPIO0, 7 GPIO2, 8 RDT

## ESP8266 ESP-03
designator IC*
footprint ESP8266 ESP-03
pins: 1 VDD, 2 NC, 3 GPIO12, 4 GPIO13, 5 GPIO15, 6 GPIO2, 7 GPIO0, 8 GND, 9 NC, 10 TxD, 11 RxD, 12 GPIO16, 13 CH_PD, 14 WiFi_ANT

## ESP8266 ESP-04
designator IC*
footprint ESP8266 ESP-04
pins: 1 VDD, 2 NC, 3 GPIO12, 4 GPIO13, 5 GPIO15, 6 GPIO2, 7 GPIO0, 8 GND, 9 NC, 10 TxD, 11 RxD, 12 GPIO16, 13 CH_PD, 14 WiFi_ANT

## ESP8266 ESP-05
designator IC*
footprint ESP8266 ESP-05
pins: 1 RST, 2 GND, 3 RxD, 4 TxD, 5 VDD

## ESP8266 ESP-06
designator IC*
footprint ESP8266 ESP-06
pins: 1 GND, 2 GPIO14, 3 GPIO12, 4 GPIO13, 5 GND, 6 GPIO15, 7 GPIO2, 8 GPIO0, 9 GND, 10 RxD, 11 TxD, 12 GPIO16, 13 GND, 14 WiFI-ANT, 15 VDD, 16 CH_PD

## ESP8266 ESP-07
designator IC*
pins: 1 VDD (power), 2 GPIO14, 3 GPIO12, 4 GPIO13, 5 GPIO15, 6 GPIO02, 7 GPIO00, 8 GND, 9 NC, 10 TxD, 11 RxD, 12 GPIO16, 13 CH_PD, 14 WiFi_ANT

## ESP8266 ESP-08
designator IC*
footprint ESP8266 ESP-08
pins: 1 VDD (power), 2 GPIO14, 3 GPIO12, 4 GPIO13, 5 GPIO15, 6 GPIO02, 7 GPIO0, 8 GND, 9 NC, 10 TxD, 11 RxD, 12 GPIO16, 13 CH_PD, 14 WiFi_ANT

## ESP8266 ESP-09
designator IC*
footprint ESP8266 ESP-09
pins: 1 GND (power), 2 GPIO14, 3 GPIO12, 4 GPIO13, 5 GND (power), 6 GPIO15, 7 GPIO02, 8 GPIO0, 9 GND (power), 10 RxD, 11 TxD, 12 RST, 13 GND (power), 14 WiFi_ANT, 15 VDD (power), 16 CH_PD

## ESP8266 ESP-10
designator IC*
footprint ESP8266 ESP-10
pins: 1 GND, 2 RxD, 3 TxD, 4 VDD, 5 RST

## ESP8266 ESP-11
designator IC*
footprint ESP8266 ESP-11
pins: 1 VDD, 2 GPIO1, 3 GPIO0, 4 TxD, 5 RxD, 6 RST, 7 CH_EN, 8 GND

## ESP8266 ESP-12-E
designator IC*
pins: 1 ~{RST} "Reset", 2 ADC/TOUT "ADC Input Or TOUT Output", 3 EN "Chip enable", 4 GPIO16/~{WAKE} "GPIO16 or Deep-Sleep Wakeup", 5 GPIO14/HSPICLK "GPIO14 or SPI CLK", 6 GPIO12/HSPIQ "GPIO12 or SPIQ", 7 GPIO13/HSPID/CTS0/RXD2 "GPIO13 or SPID", 8 VDD "Power supply", 9 SPI_MOSI/SD_CMD "GPIO14 or SPI CLK", 10 SPI_MISO/SD_D0 "GPIO12 or SPIQ", 11 GPIO9/SD_D2 "GPIO13 or SPID", 12 GPIO10/SPI_CS/SD_D3 "GPIO15 or SPICS", 13 SPI_INT/SD_D1 "GPIO2 or TX", 14 SPI_CLK/SD_CLK "GPIO0 or SPICS2", 15 GND "Power ground", 16 GPIO15/HSPICS/RTS0/TXD2 "GPIO15 or SPICS", 17 GPIO2/TXD1 "GPIO2 or TX", 18 GPIO0/SPICS2 "GPIO0 or SPICS2", 19 GPIO4 "GPIO5", 20 GPIO5 "GPIO4", 21 GPIO3/RXD0 "GPIO3 or UART RXD", 22 GPIO1/SPICS1/TXD0 "GPIO1 or UART TXD"

## ESP8266 ESP_12
designator U?
ESP8266 ESP-12; IC: ESP8266-EX; Vendor: Ai-thinker; LatestReviewer: Zion Blue; Published: 14-Apr-2015; Publisher: Cynetik Group; LatestRevisionData: 14-Apr-2015; LatestRevisionNote: Include 3D body and Footprint
footprint ESP8266 ESP_12 (ESP8266 ESP-12)
pins: 1 ~{RST} "Reset", 2 ADC/TOUT "ADC Input Or TOUT Output", 3 EN "Chip enable", 4 GPIO16/~{WAKE} "GPIO16 or Deep-Sleep Wakeup", 5 GPIO14/HSPICLK "GPIO14 or SPI CLK", 6 GPIO12/HSPIQ "GPIO12 or SPIQ", 7 GPIO13/HSPID/CTS0/RXD2 "GPIO13 or SPID", 8 VDD "Power supply", 9 GND "Power ground", 10 GPIO15/HSPICS/RTS0/TXD2 "GPIO15 or SPICS", 11 GPIO2/TXD1 "GPIO2 or TX", 12 GPIO0/SPICS2 "GPIO0 or SPICS2", 13 GPIO4 "GPIO5", 14 GPIO5 "GPIO4", 15 GPIO3/RXD0 "GPIO3 or UART RXD", 16 GPIO1/SPICS1/TXD0 "GPIO1 or UART TXD"

## ESP8266EX
designator X?
footprint QFN32
pins: 1 VDDA, 2 LNA, 3 VDD3P3, 4 VDD3P3, 5 VDD_RTC, 6 TOUT, 7 CHIP_EN, 8 XPD_DCDC, 9 MTMS, 10 MTDI, 11 VDDPST, 12 MTCK, 13 MTDO, 14 GPIO2, 15 GPIO0, 16 GPIO4, 17 VDDPST, 18 SD_DATA_2, 19 SD_DATA_3, 20 SD_CMD, 21 SD_CLK, 22 SD_DATA_0, 23 SD_DATA_1, 24 GPIO5, 25 U0RXD, 26 U0TXD, 27 XTAL_OUT, 28 XTAL_IN, 29 VDDD, 30 VDDA, 31 RES12K, 32 EXT_RSTB

## ESP-32S_Module
designator U?  (value not drawn)
WiFi Modules ROHS; Datasheet: https://espressif.com/sites/default/files/documentation/esp_wroom_32_datasheet_en.pdf
footprint ESP32S_W (Esp32S Module wide for hand soldering)
pins: 1 GND (power), 2 VDD33 (power), 3 CHP_PU (power), 4 SENSOR_VP, 5 SENSOR_VN, 6 GPI34, 7 GPI35, 8 GPO32, 9 GPO33, 10 GPIO25, 11 GPIO26, 12 GPIO27, 13 GPIO14, 14 GPIO12, 15 GND (power), 16 GPIO13, 17 SWP/SD2, 18 SHD/SD3, 19 SCS/CMD, 20 SCK/CLK, 21 SDO/SD0, 22 SD1/SD1, 23 GPIO15, 24 GPIO2, 25 GPIO0, 26 GPIO4, 27 GPIO16, 28 GPIO17, 29 GPIO5, 30 GPIO18, 31 GPIO19, 32 NC, 33 GPIO21, 34 U0RXD, 35 U0TXD, 36 GPIO22, 37 GPIO23, 38 GND (power), 101 PAD (power)

## EVQQ7GA50
designator SQ?
footprint EVQQ7GA50
pins: A, B, C, COM1, COM2, COM3, D, E

## F15D
designator X?, comment SUB-D   HDH is also known as a 'right angle VGA' connector
footprint F15D
pins: 1, 2, 3, 4, 5, 6, 7, 8, 9, 10, 11, 12, 13, 14, 15

## F15H
designator X?, comment SUB-D   HDH is also known as a 'right angle VGA' connector
footprint F15H
pins: 1, 2, 3, 4, 5, 6, 7, 8, 9, 10, 11, 12, 13, 14, 15

## F15HDH
designator X?, comment SUB-D   HDH is also known as a 'right angle VGA' connector
footprint HDF15H
pins: 1, 2, 3, 4, 5, 6, 7, 8, 9, 10, 11, 12, 13, 14, 15
